# Altium footprint library Pasivos.PcbLib: 138 footprints (part 2 of 9)
Each footprint in its own frame and in the unit in brackets; x right, y up, seen from the top. Pads: shape width x height; smd on the part's side, far side on the other; paste and mask are expansions set on the pad; w line width, h text height; cw(c..) or ccw(c..) is an arc to the next point about the centre after c.
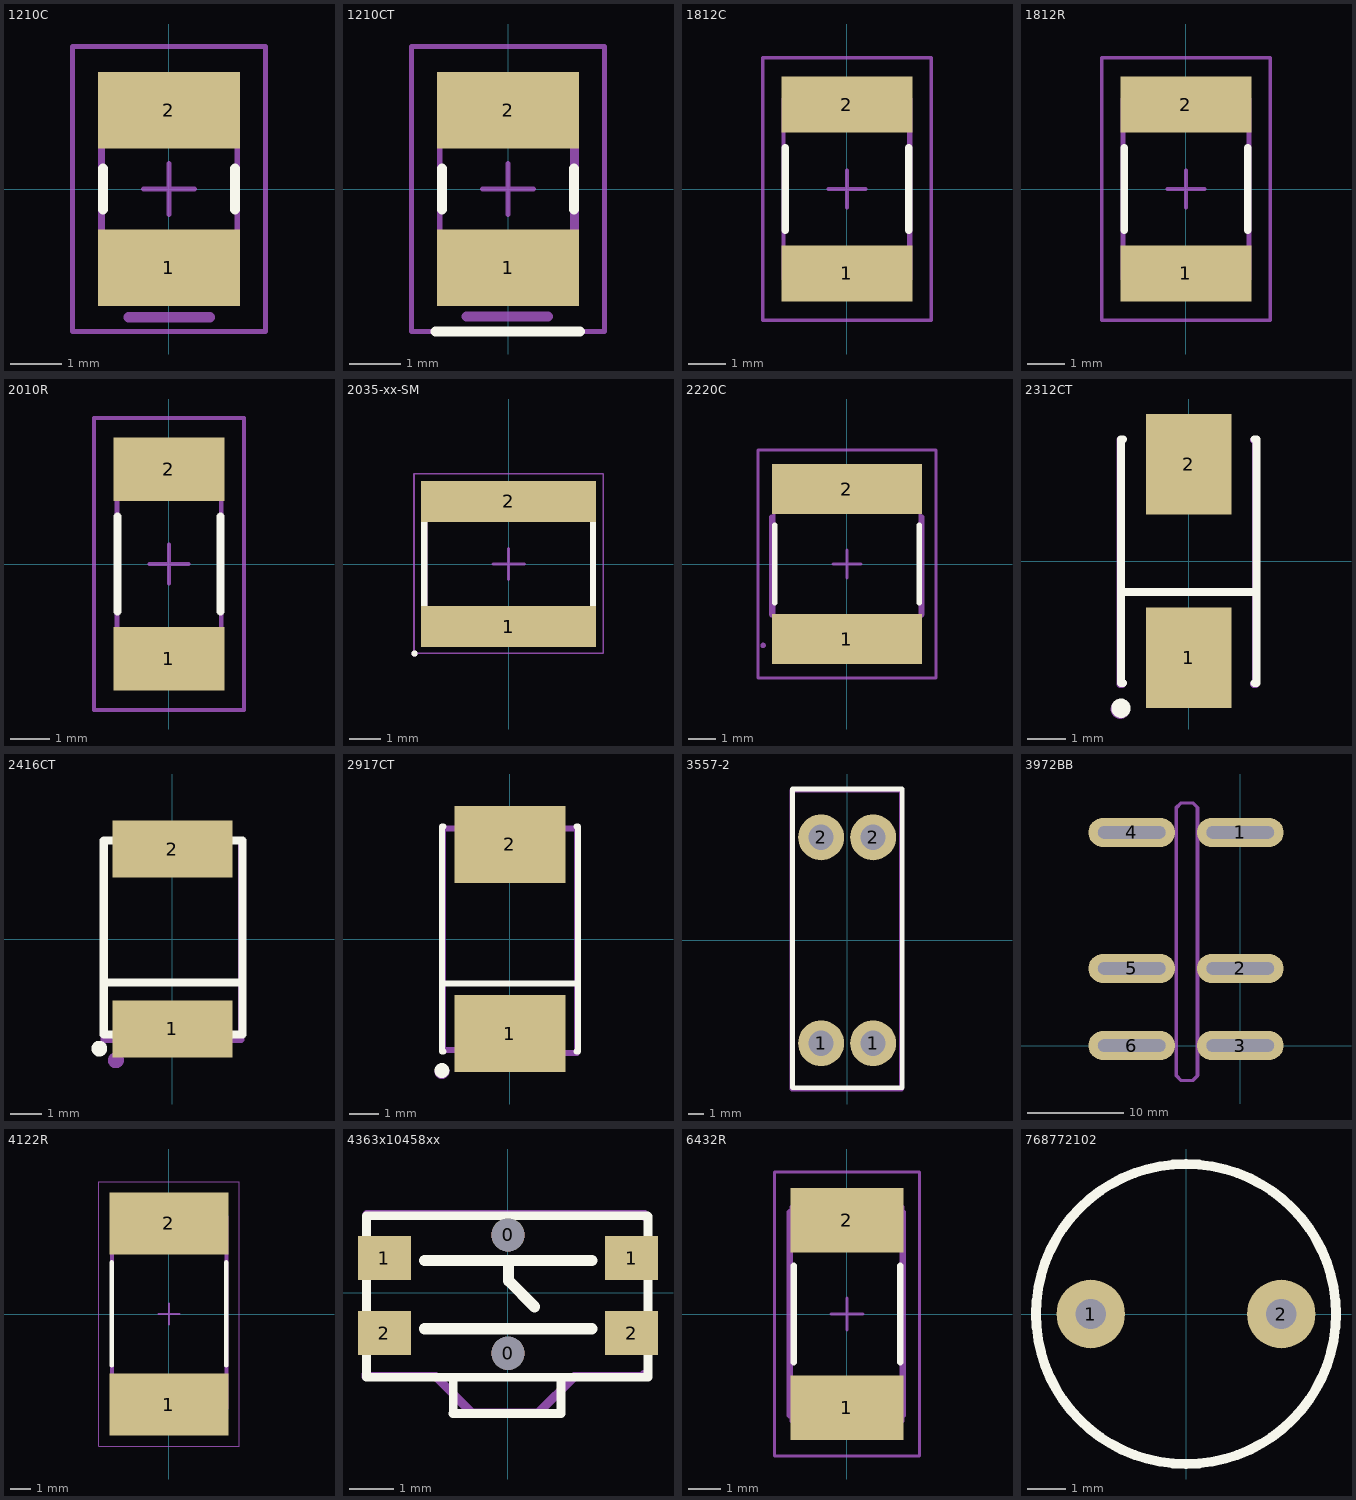
[diagram p1: the footprints below, top view; thin cyan lines are the x and y axes]

## 1210C [mm] "Chip Capacitor, Body 3.2x2.5mm, IPC Low Density"
height 1.35
pads (2):
  rect 2.8x1.5 smd: 1(0,-1.55) 2(0,1.55)
Top Overlay:
  lines w0.2: -1.3,-0.4 -1.3,0.4 ; 1.3,-0.4 1.3,0.4
Mechanical 13:
  lines w0.1: -1.35,-1.7 1.35,-1.7 1.35,1.7 -1.35,1.7 -1.35,-1.7
Mechanical 15:
  lines w0.1: -0.5,0 0.5,0 ; 0,-0.5 0,0.5 ; -1.9,-2.8 1.9,-2.8 1.9,2.8 -1.9,2.8 -1.9,-2.8
Mechanical 29:
  lines w0.1: -1.305,-2.123 1.334,-2.123 1.334,2.121 -1.305,2.121 -1.305,-2.123
  lines w0.2: -0.795,-2.522 0.805,-2.522
  text "'.Designator'" at 0.216,-1.867 h0.5
3D body "CAP1210.STEP": height 2.5, standoff 0, extent -1.27,-1.63 1.23,1.57

## 1210CT [mm] "Chip Capacitor, Body 3.2x2.5mm, IPC Low Density"
height 1.35
pads (2):
  rect 2.8x1.5 smd: 1(0,-1.55) 2(0,1.55)
Top Overlay:
  lines w0.2: -1.42,-2.8 1.41,-2.8 ; -1.3,-0.4 -1.3,0.4 ; 1.3,-0.4 1.3,0.4
Mechanical 13:
  lines w0.1: -1.35,-1.7 1.35,-1.7 1.35,1.7 -1.35,1.7 -1.35,-1.7
Mechanical 15:
  lines w0.1: -0.5,0 0.5,0 ; 0,-0.5 0,0.5 ; -1.9,-2.8 1.9,-2.8 1.9,2.8 -1.9,2.8 -1.9,-2.8
Mechanical 29:
  lines w0.1: -1.334,-2.108 -1.334,2.136 1.272,2.136 1.272,-2.108 -1.334,-2.108
  lines w0.2: -0.812,-2.507 0.788,-2.507
  text "'.Designator'" at 0.199,-1.851 h0.5
3D body "AVX_BCASE.step": height 2.03, standoff 0, extent -1.435,-1.85 1.495,1.85

## 1812C [mm] "Capacito Resistor, Body 4.5x3.2mm, IPC Low Density"
height 0.7
pads (2):
  rect 3.5x1.5 smd: 1(0,-2.25) 2(0,2.25)
Top Overlay:
  lines w0.2: -1.65,-1.1 -1.65,1.1 ; 1.65,-1.1 1.65,1.1
Mechanical 13:
  lines w0.1: -1.7,-2.4 1.7,-2.4 1.7,2.4 -1.7,2.4 -1.7,-2.4
Mechanical 15:
  lines w0.1: -0.5,0 0.5,0 ; 0,-0.5 0,0.5 ; -2.25,-3.5 2.25,-3.5 2.25,3.5 -2.25,3.5 -2.25,-3.5
Mechanical 29:
  lines w0.1: -1.685,-2.571 -1.685,2.515 1.646,2.515 1.646,-2.571 -1.685,-2.571
  text "'.Designator'" at 0.185,-2.276 h0.5
3D body "1812C.step": height 1.6, standoff 0, extent -1.6,-2.17 1.6,2.33

## 1812R [mm] "Chip Resistor, Body 4.5x3.2mm, IPC Low Density"
height 0.7
pads (2):
  rect 3.5x1.5 smd: 1(0,-2.25) 2(0,2.25)
Top Overlay:
  lines w0.2: -1.65,-1.1 -1.65,1.1 ; 1.65,-1.1 1.65,1.1
Mechanical 13:
  lines w0.1: -1.7,-2.4 1.7,-2.4 1.7,2.4 -1.7,2.4 -1.7,-2.4
Mechanical 15:
  lines w0.1: -0.5,0 0.5,0 ; 0,-0.5 0,0.5 ; -2.25,-3.5 2.25,-3.5 2.25,3.5 -2.25,3.5 -2.25,-3.5
Mechanical 29:
  lines w0.1: -1.669,-2.587 1.661,-2.587 1.661,2.499 -1.669,2.499 -1.669,-2.587
  text "'.Designator'" at 0.201,-2.292 h0.5
3D body "1812R.step": height 1.6, standoff 0, extent -1.6,-2.17 1.6,2.33

## 2010R [mm] "Chip Resistor, Body 5.0x2.5mm, IPC Low Density"
height 0.71
pads (2):
  rect 2.8x1.6 smd: 1(0,-2.4) 2(0,2.4)
Top Overlay:
  lines w0.2: -1.3,-1.2 -1.3,1.2 ; 1.3,-1.2 1.3,1.2
Mechanical 13:
  lines w0.1: -1.325,-2.575 1.325,-2.575 1.325,2.575 -1.325,2.575 -1.325,-2.575
Mechanical 15:
  lines w0.1: -0.5,0 0.5,0 ; 0,-0.5 0,0.5 ; -1.9,-3.7 1.9,-3.7 1.9,3.7 -1.9,3.7 -1.9,-3.7
Mechanical 29:
  lines w0.1: -1.302,-2.57 -1.302,2.516 1.315,2.516 1.315,-2.57 -1.302,-2.57
  text "'.Designator'" at 0.185,-2.275 h0.5
3D body "2010r.STEP": height 0.62, standoff 0, extent -1.35,-3.048 1.35,2.952

## 2035-xx-SM [mm] "Precision Gas Discharge Tube Surge Protector"
height 0.6
pads (2):
  rect 5.6x1.3 smd: 1(0,-2) 2(0,2)
Top Overlay:
  circle w0.1: c-3.012,-2.862 r0.05
  lines w0.2: -2.7,-1.75 -2.7,1.75 ; 2.7,-1.75 2.7,1.75
Mechanical 15:
  lines w0.05: -3.03,-2.86 -3.03,2.89 3.02,2.89 3.02,-2.86 -3.03,-2.86
  lines w0.1: -0.5,0 0.5,0 ; 0,-0.5 0,0.5
Mechanical 29:
  circle w0.1: c-3.012,-2.862 r0.05
  lines w0.2: -2.7,-1.75 -2.7,1.75 ; 2.7,-1.75 2.7,1.75
  text "'.Designator'" at -2.372,-0.122 h0.5
3D body "2035-xx-SM-1.step": height 4.4, standoff 0, extent -2.49,-2.55 2.51,2.479

## 2220C [mm] "Chip Capacitor, Body 5.7x5.0mm, IPC Low Density"
height 1.35
pads (2):
  rect 5.4x1.8 smd: 1(0,-2.7) 2(0,2.7)
Top Overlay:
  lines w0.2: -2.6,-1.4 -2.6,1.4 ; 2.6,-1.4 2.6,1.4
Mechanical 13:
  lines w0.1: -2.625,-2.95 -2.625,2.95 2.625,2.95 2.625,-2.95 -2.625,-2.95
Mechanical 15:
  lines w0.1: -0.5,0 0.5,0 ; 0,-0.5 0,0.5 ; -3.2,-4.1 -3.2,4.1 3.2,4.1 3.2,-4.1 -3.2,-4.1
Mechanical 29:
  circle w0.1: c-3.021,-2.929 r0.05
  lines w0.2: -2.709,-1.817 -2.709,1.683 ; 2.691,-1.817 2.691,1.683
  text "'.Designator'" at -2.381,-0.189 h0.5
3D body "CAPC5750X23.step": height 2.3, standoff 0, extent -2.56,-2.85 2.44,2.85

## 2312CT [mm] "Capacitor Tantalum 2312 (6032 metric)"
pads (2):
  rect 2.2x2.6 smd: 1(0,-2.5) 2(0,2.5)
Top Overlay:
  circle w0.25: c-1.75,-3.8 r0.125
  lines w0.2: -1.75,-0.8 1.75,-0.8 ; -1.7,-3.15 -1.75,-3.15 -1.75,3.15 -1.7,3.15 ; 1.7,-3.15 1.75,-3.15 1.75,3.15 1.7,3.15
Mechanical 29:
  circle w0.25: c-1.766,-3.824 r0.125
  lines w0.2: -1.716,-3.174 -1.766,-3.174 -1.766,3.126 -1.716,3.126 ; 1.684,-3.174 1.734,-3.174 1.734,3.126 1.684,3.126
  text "'.Designator'" at 0.162,-2.787 h0.5
3D body "2312CT.STEP": height 2.5, standoff 0, extent -1.883,-2.952 1.905,3.048

## 2416CT [mm] "CAP FILM"
pads (2):
  rect 3.8x1.8 smd: 1(0,-2.835) 2(0,2.835)
Top Overlay:
  circle w0.254: c-2.31,-3.46 r0.12
  lines w0.254: -2.14,-1.38 2.18,-1.38 ; -2.17,-3.015 -2.17,3.105 2.21,3.105 2.21,-3.015 -2.17,-3.015
Mechanical 29:
  circle w0.25: c-1.785,-3.829 r0.125
  lines w0.2: -1.735,-3.179 -2.179,-3.179 -2.179,3.121 -1.735,3.121 ; 1.665,-3.179 2.17,-3.179 2.17,3.121 1.665,3.121
  text "'.Designator'" at 0.143,-2.792 h0.5
3D body "ECH-U1H154GX9.stp": height 2.03, standoff 0.02, extent -2.119,-3.057 2.199,3.167

## 2917CT [mm]
pads (2):
  rect 3.75x2.6 smd: 1(0,-3.2) 2(0,3.2)
Top Overlay:
  circle w0.25: c-2.3,-4.45 r0.125
  lines w0.2: -2.3,-1.5 2.3,-1.5 ; -2.25,-3.8 -2.3,-3.8 -2.3,3.8 -2.25,3.8 ; 2.25,-3.8 2.3,-3.8 2.3,3.8 2.25,3.8
Mechanical 29:
  circle w0.25: c-2.295,-4.484 r0.125
  lines w0.2: -1.691,-3.761 -2.256,-3.761 -2.256,3.742 -1.691,3.742 ; 1.709,-3.859 2.277,-3.859 2.277,3.742 1.709,3.742
  text "'.Designator'" at 0.187,-2.808 h0.5
3D body "CAP 7343.step": height 2.25, standoff 0.02, extent -2.15,-3.642 2.15,3.658

## 3557-2 [mm] "FUSE BLOCK BLADE 500V 20A PCB"
pads (4):
  round 3 hole 1.65: 1(-1.7,-6.735) 1(1.7,-6.735) 2(-1.7,6.735) 2(1.7,6.735)
Top Overlay:
  lines w0.3: -3.575,-9.661 -3.575,9.899 3.595,9.899 3.595,-9.661 -3.575,-9.661
Mechanical 29:
  lines w0.3: -3.61,-9.73 3.56,-9.73 3.56,9.83 -3.61,9.83 -3.61,-9.73
  text "'.Designator'" at 0.235,-2.644 h0.5
3D body "3557-2.STEP": height 19.63, standoff -2.8, extent -3.27,-9.895 3.46,9.915

## 3972BB [mm]
pads (6):
  oval 9x3 hole 1.3 slot 7 at 0 deg: 1(0,22.1) 2(0,8) 3(0,0) 4(-11.25,22.1) 5(-11.25,8) 6(-11.25,0)
Mechanical 1:
  lines w0.3: -6.591,-3.11 -6.081,-3.62 -4.871,-3.62 -4.371,-3.12 -4.371,24.68 -4.851,25.16 -6.091,25.16 -6.591,24.66 -6.591,-3.11
Mechanical 29:
  lines w0.3: -6.69,-3.11 -6.18,-3.62 -4.97,-3.62 -4.47,-3.12 -4.47,24.68 -4.95,25.16 -6.19,25.16 -6.69,24.66 -6.69,-3.11
  text "'.Designator'" at -5.328,4.583 h0.5
3D body "Arcolectric_3972BB.STEP": height 52.2, standoff -7.8, extent -16.41,-4.7 5.09,26.8

## 4122R [mm] "SMD Moulded Power Resistor"
height 5
pads (2):
  rect 5.74x3 smd: 1(0,-4.385) 2(0,4.385)
Top Overlay:
  lines w0.2: -2.77,-2.495 -2.77,2.505 ; 2.77,-2.495 2.77,2.505
Mechanical 13:
  lines w0.1: -2.75,-5.245 2.75,-5.245 2.75,5.255 -2.75,5.255 -2.75,-5.245
Mechanical 15:
  lines w0.05: -3.4,-6.395 3.4,-6.395 3.4,6.405 -3.4,6.405 -3.4,-6.395
  lines w0.1: -0.5,0.005 0.5,0.005 ; 0,-0.495 0,0.505
Mechanical 29:
  lines w0.2: -1.75,-4.624 -2.759,-4.624 -2.759,4.751 -1.75,4.751 ; 1.65,-4.575 2.787,-4.575 2.787,4.726 1.65,4.726
  text "'.Designator'" at 0.128,-2.809 h0.5
3D body "4122R.step": height 5, standoff 0, extent -2.75,-5.245 2.75,5.255

## 4363x10458xx [mm] "Tactile Switch SPST-NO Side Actuated Surface Mount, Right Angle"
pads (6):
  round 0.75 hole 0.75: 0(0,-1.375) 0(0,1.308)
  rect 1.2x1 smd: 1(-2.8,0.783) 1(2.8,0.783) 2(-2.8,-0.917) 2(2.8,-0.917)
Top Overlay:
  lines w0.2: -1.24,-1.92 -1.24,-2.73 -1.25,-2.74 1.2,-2.74 1.2,-1.98 ; -3.21,-1.92 -3.21,1.74 3.16,1.74 3.17,1.73 3.17,-1.92 -3.21,-1.92
  lines w0.254: -1.89,-0.82 1.9,-0.82 ; -1.89,0.73 1.9,0.73 ; 0.01,0.7 0.01,0.27 0.6,-0.32
Mechanical 29:
  lines w0.2: -3.215,-1.853 -3.215,-1.903 -1.64,-1.903 -0.82,-2.723 0.69,-2.723 1.51,-1.903 3.085,-1.903 3.085,-1.853 ; -3.201,1.72 -3.201,1.77 3.099,1.77 3.099,1.72
  text "'.Designator'" at -2.831,-0.186 h0.5
3D body "436351045816-rev1.stp": height 1.65, standoff -0.5, extent -3.21,-2.77 3.19,1.73

## 6432R [mm] "Chip Resistor, Body 6.4x3.2mm, IPC Low Density"
height 1.1
pads (2):
  rect 3.5x2 smd: 1(0,-2.9) 2(0,2.9)
Top Overlay:
  lines w0.2: -1.65,-1.5 -1.65,1.5 ; 1.65,-1.5 1.65,1.5
Mechanical 13:
  lines w0.1: -1.725,-3.325 1.725,-3.325 1.725,3.325 -1.725,3.325 -1.725,-3.325
Mechanical 15:
  lines w0.1: -0.5,0 0.5,0 ; 0,-0.5 0,0.5 ; -2.25,-4.4 2.25,-4.4 2.25,4.4 -2.25,4.4 -2.25,-4.4
Mechanical 29:
  lines w0.2: -1.719,-3.144 -1.769,-3.144 -1.769,3.156 -1.719,3.156 ; 1.681,-3.144 1.731,-3.144 1.731,3.156 1.681,3.156
  text "'.Designator'" at 0.159,-2.757 h0.5
3D body "RESC6432X06.step": height 0.6, standoff 0, extent -1.62,-3.18 1.58,3.22

## 768772102 [mm]
height 9.5
pads (2):
  round 1.8 hole 0.8: 1(-2.5,0) 2(2.5,0)
Top Overlay:
  circle w0.254: c0,0 r3.937
3D body "44988.STEP": height 11, standoff -6.5, extent -5.334,-5.303 5.363,5.394